# Altium footprint library xhayqua.PcbLib: 185 footprints (part 8 of 12)
Each footprint in its own frame and in the unit in brackets; x right, y up, seen from the top. Pads: shape width x height; smd on the part's side, far side on the other; paste and mask are expansions set on the pad; w line width, h text height; cw(c..) or ccw(c..) is an arc to the next point about the centre after c.
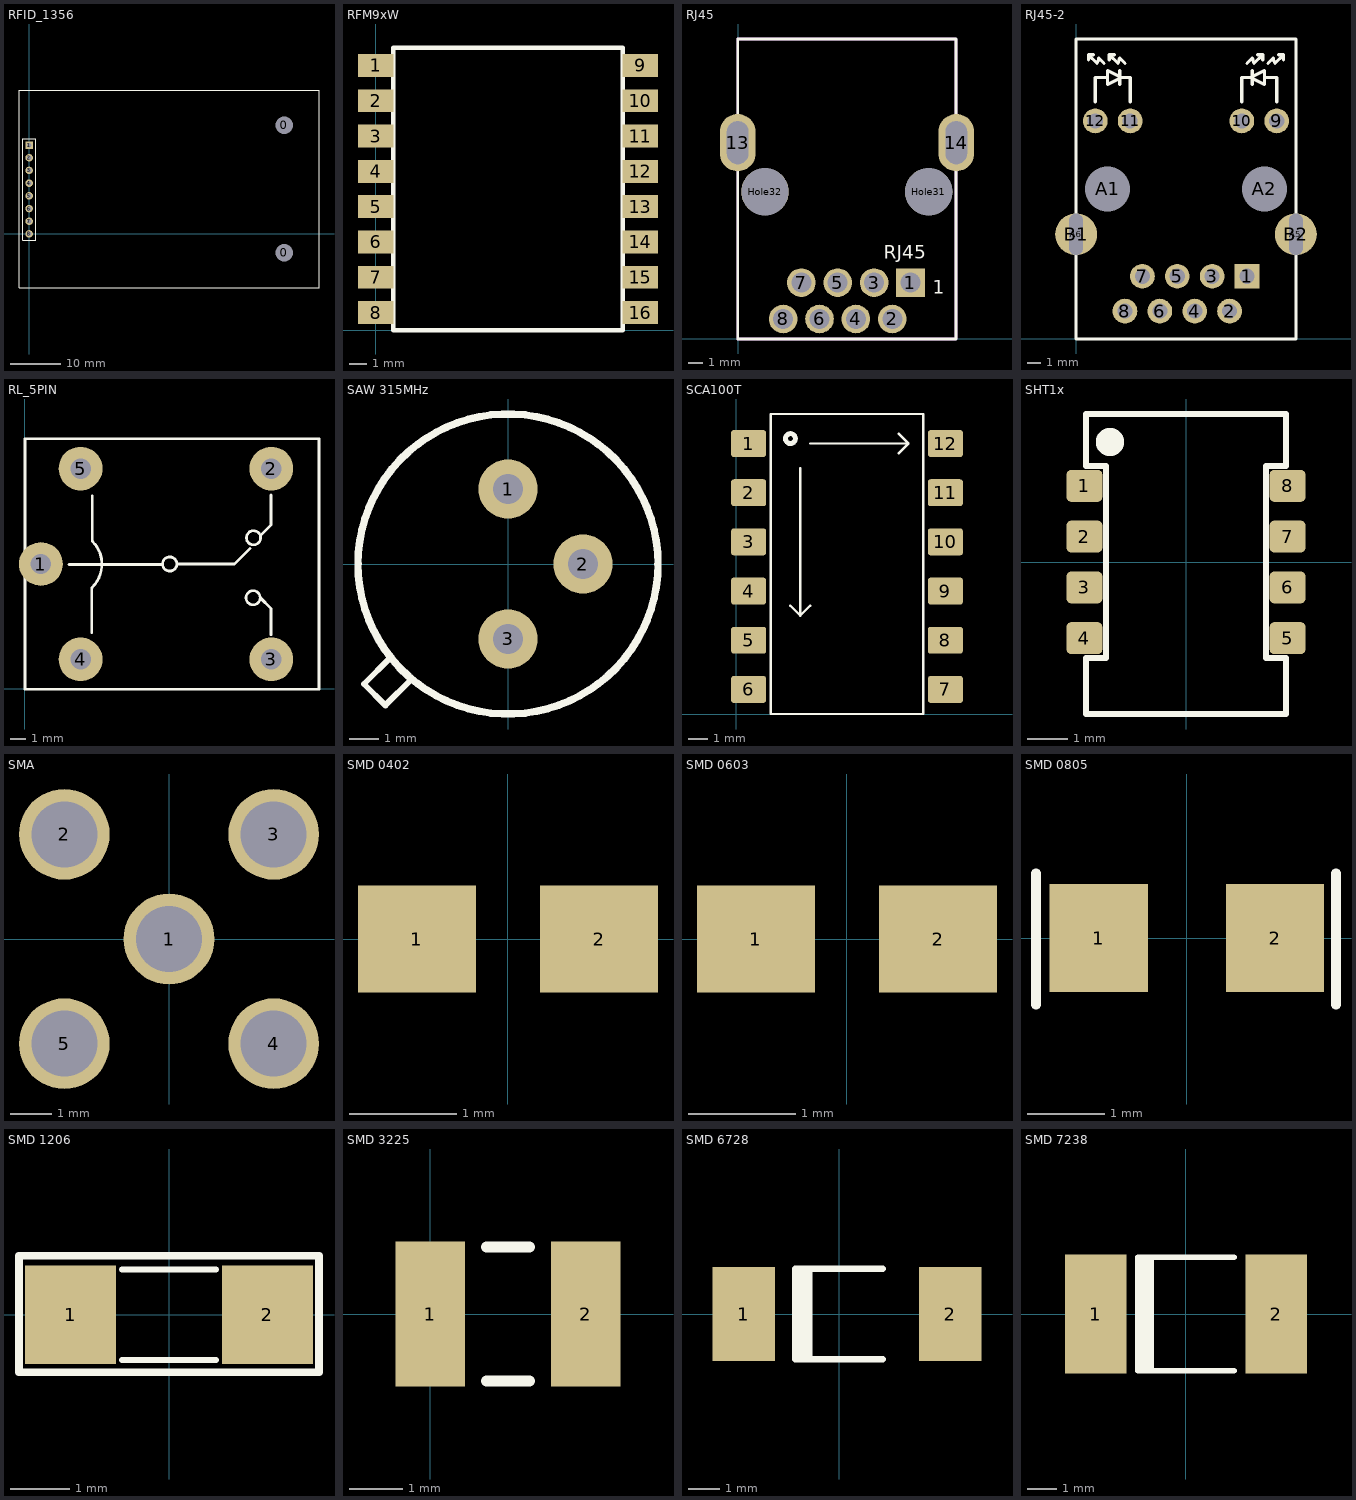
[diagram p7: the footprints below, top view; thin cyan lines are the x and y axes]

## RFID_1356 [mm]
pads (10):
  round 3 hole 3.5: 0(50.968,-3.718) 0(50.968,21.702)
  rect 1.5x1.5 hole 0.9: 1(0,17.78)
  round 1.5 hole 0.9: 2(0,15.24) 3(0,12.7) 4(0,10.16) 5(0,7.62) 6(0,5.08) 7(0,2.54) 8(0,0)
Top Layer:
  lines w0.4: 0,10.16 0.381,10.16
Top Overlay:
  lines w0.2: -2.032,-10.718 -2.032,28.702 57.968,28.702 57.968,-10.718 -2.032,-10.718 ; -1.27,-1.27 -1.27,19.05 1.27,19.05 1.27,-1.27 -1.27,-1.27

## RFM9xW [mm] "HopeRF"
pads (16):
  rect 2x1.3 smd: 1(0,15) 2(0,13) 3(0,11) 4(0,9) 5(0,7) 6(0,5) 7(0,3) 8(0,1) 9(15,15) 10(15,13) 11(15,11) 12(15,9) 13(15,7) 14(15,5) 15(15,3) 16(15,1)
Top Overlay:
  lines w0.254: 1,0 1,16 14,16 14,0 1,0
3D body "User Library-RFM96W.STEP": height 2.23, standoff -0.01, extent -0.501,0 15.501,15.9

## RJ45 [mm]
pads (12):
  rect 2x2 hole 1.4: 1(12.04,3.937)
  round 2 hole 1.4: 2(10.77,1.397) 3(9.5,3.937) 4(8.23,1.397) 5(6.96,3.937) 6(5.69,1.397) 7(4.42,3.937) 8(3.15,1.397)
  oval 2.5x4 hole 1.5 slot 3 at 90 deg: 13(-0.025,13.716) 14(15.24,13.716)
  round 3.3 hole 3.3: Hole31(13.31,10.287) Hole32(1.88,10.287)
Top Overlay:
  lines w0.203: 15.215,15.519 15.215,18.161 15.215,20.955 -0.025,20.955 -0.025,18.161 -0.025,15.684 -0.025,0 15.215,0 15.215,15.684
  text "RJ45" at 10.16,5.588 h0.95
  text "1" at 13.592,3.159 h0.95
Mechanical 2:
  lines w0.203: 15.215,15.519 15.215,18.161 15.215,20.955 -0.025,20.955 -0.025,18.161 -0.025,15.684 -0.025,0 15.215,0 15.215,15.684
  text "1" at 13.592,3.159 h0.95
  text "1" at 13.592,3.159 h0.95
3D body "Halo RJ45 Socket HFJ11-1G01ERL.STEP": height 15.07, standoff -3.62, extent -1.982,-0.508 17.018,21.082

## RJ45-2 [mm]
pads (18):
  rect 1.8x1.8 / inner rect 1.778x1.778 / far side rect 1.8x1.8 hole 1.1: 1(12.446,4.572)
  round 1.8 / inner round 1.778 / far side round 1.8 hole 1.1: 2(11.176,2.032) 3(9.906,4.572) 4(8.636,2.032) 5(7.366,4.572) 6(6.096,2.032) 7(4.826,4.572) 8(3.556,2.032) 9(14.605,15.875) 10(12.065,15.875) 11(3.937,15.875) 12(1.397,15.875)
  round 3 hole 3.3: A1(2.286,10.922) A2(13.716,10.922)
  round 1 hole 1 slot 3 at 90 deg: A5(16.002,7.62) A6(0,7.62)
  round 3.048 / inner round 2.54 / far side round 3.048 all layers, no hole: B1(0,7.62) B2(16.002,7.62)
Top Overlay:
  lines w0.229: 0.889,20.32 0.889,20.701 ; 1.27,20.701 0.889,20.701 ; 1.397,17.272 1.397,19.05 2.286,19.05 ; 2.032,20.066 1.651,20.447 1.524,20.066 0.889,20.701 ; 2.413,20.32 2.413,20.701 ; 2.794,20.701 2.413,20.701 ; 3.175,18.542 3.175,19.558 ; 3.175,19.05 3.937,19.05 3.937,17.272 ; 3.556,20.066 3.175,20.447 3.048,20.066 2.413,20.701 ; 12.065,17.272 12.065,19.05 12.827,19.05 ; 12.446,20.066 12.827,20.447 12.954,20.066 13.589,20.701 ; 12.827,18.542 12.827,19.558 ; 13.208,20.701 13.589,20.701 ; 13.589,20.32 13.589,20.701 ; 13.716,19.05 14.605,19.05 14.605,17.272 ; 13.97,20.066 14.351,20.447 14.478,20.066 15.113,20.701 ; 14.732,20.701 15.113,20.701 ; 15.113,20.32 15.113,20.701 ; 0,0 8.001,0 16.002,0 16.002,10.922 16.002,21.844 8.001,21.844 0,21.844 0,10.922 0,0 ; 2.286,18.542 3.302,19.05 2.286,19.558 2.286,18.542 ; 12.7,19.05 13.716,18.542 13.716,19.558 12.7,19.05

## RL_5PIN [mm]
pads (5):
  round 2.8 hole 1.3: 1(1.041,7.976) 2(15.773,14.072) 3(15.773,1.88) 4(3.581,1.88) 5(3.581,14.072)
Top Overlay:
  circle w0.178: c14.61,5.817 r0.452
  circle w0.178: c14.635,9.652 r0.452
  circle w0.178: c9.276,7.976 r0.452
  lines w0.178: 2.845,7.95 8.763,7.95 ; 4.293,3.581 4.293,6.452 ; 4.318,6.477 ccw(c2.857,7.963) 4.343,9.423 ; 4.318,9.449 4.318,12.344 ; 9.779,7.976 13.411,7.976 14.402,8.966 ; 15.062,5.817 15.748,5.131 15.748,3.454 ; 15.088,9.804 15.748,10.465 15.748,12.395 ; 0.025,-0.025 0.025,15.977 18.821,15.977 18.821,-0.025 0.025,-0.025
3D body "User Library-10A12V.STEP": height 15.5, standoff -2.5, extent -0.179,0.2 18.821,15.7

## SAW 315MHz [mm]
pads (3):
  round 2 hole 1: 1(0,2.54) 2(2.54,0) 3(0,-2.54)
Top Overlay:
  circle w0.254: c0,0 r5.08
  lines w0.2: -3.937,-3.175 -3.988,-3.175 -4.877,-4.064 -4.153,-4.788 -3.277,-3.912 -3.226,-3.912
3D body: height 3, standoff 0, extent -4.606,-4.47 4.394,4.53

## SCA100T [mm]
pads (12):
  rrect20% 1.81x1.39 smd: 1(0.635,13.97) 2(0.635,11.43) 3(0.635,8.89) 4(0.635,6.35) 5(0.635,3.81) 6(0.635,1.27) 7(10.795,1.27) 8(10.795,3.81) 9(10.795,6.35) 10(10.795,8.89) 11(10.795,11.43) 12(10.795,13.97)
Top Overlay:
  circle w0.254: c2.794,14.224 r0.254
  lines w0.127: 2.794,5.588 3.302,5.08 ; 3.302,12.7 3.302,5.08 ; 3.81,5.588 3.302,5.08 ; 3.81,13.97 8.89,13.97 ; 8.382,13.462 8.89,13.97 ; 8.382,14.478 8.89,13.97 ; 1.778,0 1.778,15.494 9.652,15.494 9.652,0 1.778,0
3D body "User Library-SCA100T.step": height 5.34, standoff 0.01, extent 0,-0.106 11.4,15.494

## SHT1x [mm]
pads (8):
  rrect30% 0.9x0.8 smd: 1(-2.54,1.905) 2(-2.54,0.635) 3(-2.54,-0.635) 4(-2.54,-1.905) 5(2.54,-1.905) 6(2.54,-0.635) 7(2.54,0.635) 8(2.54,1.905)
Top Overlay:
  circle w0.508: c-1.9,3 r0.1
  lines w0.15: -2.5,-3.8 2.5,-3.8 2.5,-2.4 2,-2.4 2,2.4 2.5,2.4 2.5,3.7 -2.5,3.7 -2.5,2.4 -2,2.4 -2,-2.4 -2.5,-2.4 -2.5,-3.8
3D body "User Library-SHTx.step": height 2.51, standoff 0.01, extent -2.5,-3.8 2.5,3.7

## SMA [mm]
pads (5):
  round 2.2 hole 1.6: 1(0,0) 2(-2.54,2.54) 3(2.54,2.54) 4(2.54,-2.54) 5(-2.54,-2.54)
3D body "User Library-Molex RP-SMA.step": height 9.54, standoff -3.93, extent -3.302,-3.177 3.048,3.177

## SMD 0402 [mm]
height 0.762
pads (2):
  rect 1.1x1 smd: 1(-0.85,0) 2(0.85,0)

## SMD 0603 [mm]
height 2
pads (2):
  rect 1.1x1 smd: 1(-0.85,0) 2(0.85,0)

## SMD 0805 [mil] "Compoment SMD 80x50mil"
height 50
pads (2):
  rect 50x55 smd: 1(-45,0) 2(45,0)
Top Overlay:
  lines w5: -77,-34 -77,33 ; 76,-34 76,33
3D body "SW3dPS-smt_resistor_packages.STEP": height 24.02, standoff -0.39, extent -39.76,-27 39.77,23

## SMD 1206 [mil]
height 50
pads (2):
  rect 60x65 smd: 1(-65,0) 2(65,0)
Top Overlay:
  lines w4: -31,-30 31,-30 ; -31,30 31,30
  lines w5: -99,-38 -99,39 99,39 99,-38 -99,-38
3D body "User Library-res1206.STEP": height 24.79, standoff 0, extent -82.68,-35 82.68,35.87

## SMD 3225 [mm]
pads (2):
  rect 1.3x2.7 smd: 1(0,0) 2(2.9,0)
Top Overlay:
  lines w0.2: 1.05,-1.25 1.85,-1.25 ; 1.05,1.25 1.85,1.25

## SMD 6728 [mm]
pads (2):
  rect 2x3 smd: 1(-3.048,0) 2(3.556,0)
Top Overlay:
  rectangle: -1.4,-1.45 -0.85,1.45
  lines w0.2: 1.4,-1.45 -1.4,-1.45 -1.4,1.45 1.4,1.45

## SMD 7238 [mm]
pads (2):
  rect 2.1x4.1 smd: 1(-3.1,0) 2(3.1,0)
Top Overlay:
  rectangle: -1.65,-1.95 -1.1,1.95
  lines w0.2: 1.65,-1.95 -1.65,-1.95 -1.65,1.95 1.65,1.95